# Altium footprint library ALL.PcbLib: 385 footprints (part 6 of 25)
Each footprint in its own frame and in the unit in brackets; x right, y up, seen from the top. Pads: shape width x height; smd on the part's side, far side on the other; paste and mask are expansions set on the pad; w line width, h text height; cw(c..) or ccw(c..) is an arc to the next point about the centre after c.
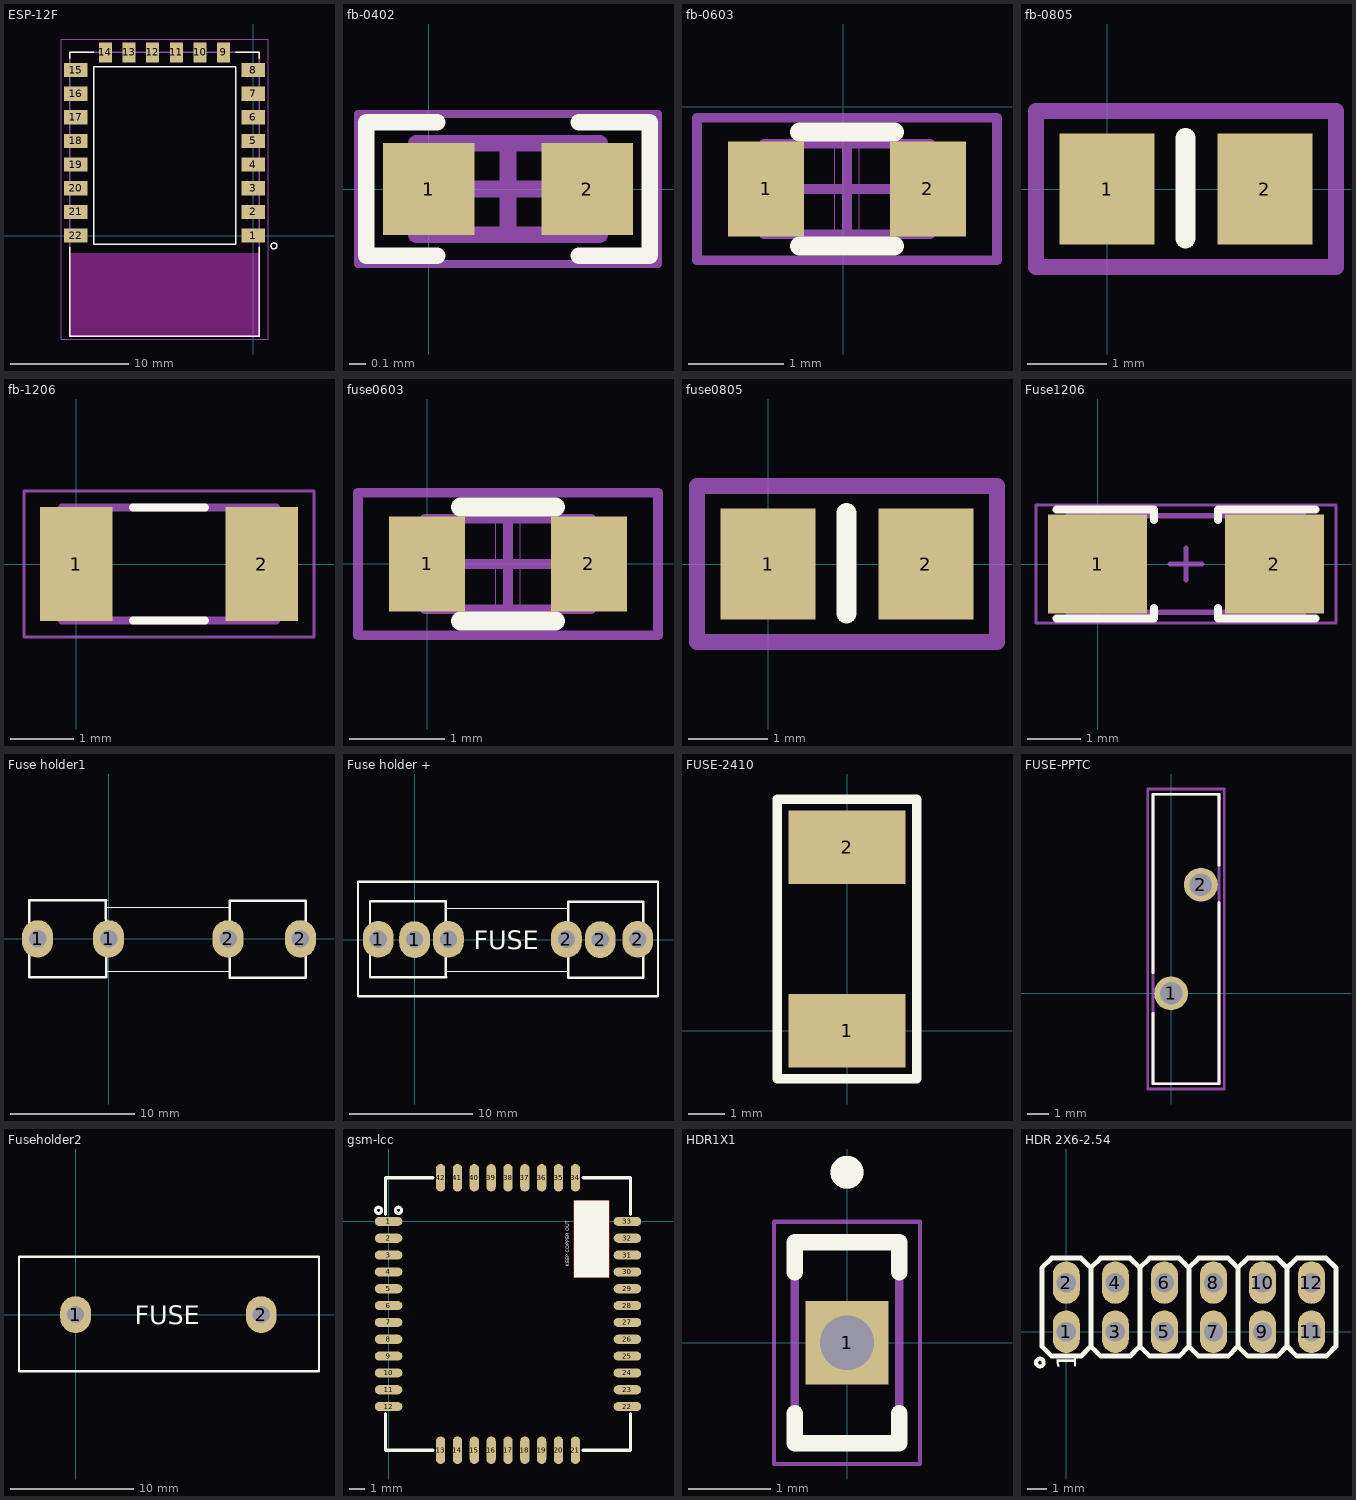
[diagram p5: the footprints below, top view; thin cyan lines are the x and y axes]

## ESP-12F [mm]
pads (22):
  rect 2x1.2 smd: 1(0,0) 2(0,2) 3(0,4) 4(0,6) 5(0,8) 6(0,10) 7(0,12) 8(0,14) 15(-15,14) 16(-15,12) 17(-15,10) 18(-15,8) 19(-15,6) 20(-15,4) 21(-15,2) 22(-15,0)
  rect 1.1x1.7 smd: 9(-2.5,15.5) 10(-4.5,15.5) 11(-6.5,15.5) 12(-8.5,15.5) 13(-10.5,15.5) 14(-12.5,15.5)
Top Overlay:
  circle w0.127: c1.75,-0.875 r0.25
  lines w0.127: -15.5,-1 -15.5,-8.5 0.5,-8.5 0.5,-1 ; -15.5,15 -15.5,15.5 -13.5,15.5 ; -1.5,15.5 0.5,15.5 0.5,15 ; -13.5,-0.74 -13.5,14.26 -1.5,14.26 -1.5,-0.74 -13.5,-0.74
Keep-Out Layer:
  region: -15.5,-1.51 0.509,-1.51 0.509,-8.5 -15.5,-8.5
  region: -15.5,-1.51 0.509,-1.51 0.509,-8.5 -15.5,-8.5
Mechanical 13:
  lines w0.127: -15.5,-8.5 -15.5,15.5 0.5,15.5 0.5,-8.5 -15.5,-8.5
Mechanical 15:
  lines w0.05: -16.25,-8.75 1.25,-8.75 1.25,16.625 -16.25,16.625 -16.25,-8.75
3D body "ESP-12S--3DModel-STEP-56544.STEP": height 3.2, standoff 0, extent -15.627,-8.429 0.373,15.571

## fb-0402 [mm]
pads (2):
  rect 0.55x0.55 smd mask+0.06: 1(0,0) 2(0.95,0)
Top Overlay:
  lines w0.1: 0.05,-0.4 -0.375,-0.4 -0.375,0.4 0.05,0.4 ; 0.9,-0.4 1.325,-0.4 1.325,0.4 0.9,0.4
Mechanical 13:
  lines w0.1: -0.075,-0.275 1.025,-0.275 1.025,0.275 -0.075,0.275 -0.075,-0.275
Mechanical 15:
  lines w0.05: -0.425,-0.45 1.375,-0.45 1.375,0.45 -0.425,0.45 -0.425,-0.45
  lines w0.1: 0.2,0 0.75,0 ; 0.475,-0.275 0.475,0.275
3D body "User Library-FB_1005.STEP": height 0.5, standoff 0, extent -0.025,-0.25 0.975,0.25

## fb-0603 [mm]
pads (2):
  rect 0.8x1 smd: 1(-0.813,-0.864) 2(0.887,-0.864)
Top Overlay:
  lines w0.2: -0.463,-1.464 0.537,-1.464 ; -0.463,-0.264 0.537,-0.264
Mechanical 10:
  lines w0.01: -0.09,-1.372 0.139,-1.372 0.164,-1.397 0.164,-0.356 -0.09,-0.356 -0.09,-1.372
Mechanical 13:
  lines w0.1: -0.838,-1.339 0.912,-1.339 0.912,-0.389 -0.838,-0.389 -0.838,-1.339
Mechanical 15:
  lines w0.1: -0.438,-0.864 0.512,-0.864 ; 0.037,-1.339 0.037,-0.389 ; -1.538,-1.614 1.612,-1.614 1.612,-0.114 -1.538,-0.114 -1.538,-1.614
3D body "User Library-FB_1608-1.STEP": height 0.8, standoff 0, extent -0.763,-1.264 0.837,-0.464

## fb-0805 [mm]
pads (2):
  rect 1.2x1.4 smd: 1(0,0) 2(2,0)
Top Overlay:
  lines w0.254: 0.994,-0.625 0.994,0.645
Mechanical 15:
  lines w0.203: -0.9,-0.991 2.9,-0.991 2.9,0.991 -0.9,0.991 -0.9,-0.991
3D body "User Library-FB_2012.STEP": height 0.85, standoff 0, extent 0.092,-0.6 2.092,0.65

## fb-1206 [mm]
pads (2):
  rect 1.16x1.82 smd: 1(0,0) 2(2.95,0)
Top Overlay:
  lines w0.127: 0.905,-0.9 2.045,-0.9 ; 0.905,0.9 2.045,0.9
Mechanical 13:
  lines w0.127: -0.225,-0.9 -0.225,0.9 3.175,0.9 3.175,-0.9 -0.225,-0.9
Mechanical 15:
  lines w0.05: -0.833,-1.158 -0.833,1.158 3.783,1.158 3.783,-1.158 -0.833,-1.158
3D body "User Library-1206 Ferrite bead.STEP": height 1.65, standoff 0.35, extent -0.127,-0.8 3.073,0.8

## fuse0603 [mm]
pads (2):
  rect 0.8x1 smd: 1(0,0) 2(1.7,0)
Top Overlay:
  lines w0.2: 0.35,-0.6 1.35,-0.6 ; 0.35,0.6 1.35,0.6
Mechanical 10:
  lines w0.01: 0.723,-0.508 0.723,0.508 0.977,0.508 0.977,-0.533 0.952,-0.508 0.723,-0.508
Mechanical 13:
  lines w0.1: -0.025,-0.475 -0.025,0.475 1.725,0.475 1.725,-0.475 -0.025,-0.475
Mechanical 15:
  lines w0.1: 0.375,0 1.325,0 ; 0.85,-0.475 0.85,0.475 ; -0.725,-0.75 -0.725,0.75 2.425,0.75 2.425,-0.75 -0.725,-0.75
3D body "User Library-USF_0603_Surface_Mount_Fuse.STEP": height 0.63, standoff 0, extent 0.165,-0.374 1.765,0.425

## fuse0805 [mm]
pads (2):
  rect 1.2x1.4 smd: 1(0,0) 2(2,0)
Top Overlay:
  lines w0.254: 0.994,-0.625 0.994,0.645
Mechanical 15:
  lines w0.203: -0.9,-0.991 -0.9,0.991 2.9,0.991 2.9,-0.991 -0.9,-0.991
3D body "User Library-fuse0805L050WR.STEP": height 1.24, standoff 0, extent -0.14,-0.749 2.07,0.749

## Fuse1206 [mm]
pads (2):
  rect 1.85x1.85 smd: 1(0,0) 2(3.3,0)
Top Overlay:
  lines w0.15: -0.763,-1.016 1.05,-1.016 1.05,-0.825 ; -0.763,1.016 1.05,1.016 1.05,0.825 ; 2.25,-0.825 2.25,-1.016 4.063,-1.016 ; 2.25,0.825 2.25,1.016 4.063,1.016
Mechanical 13:
  lines w0.1: -0.55,-0.9 3.85,-0.9 3.85,0.9 -0.55,0.9 -0.55,-0.9
Mechanical 15:
  lines w0.05: -1.15,-1.1 4.45,-1.1 4.45,1.1 -1.15,1.1 -1.15,-1.1
  lines w0.1: 1.35,0 1.95,0 ; 1.65,-0.3 1.65,0.3
3D body "User Library-nona SMD075F.STEP": height 0.66, standoff 0.1, extent 0.049,-0.826 3.251,0.826

## Fuse holder1 [mm]
pads (4):
  oval 2.5x3 hole 1.4: 1(-5.7,0) 1(0,0) 2(9.6,0) 2(15.4,0)
Top Overlay:
  lines w0.1: -0.213,2.517 9.745,2.517 ; -0.205,-2.591 9.745,-2.591
  lines w0.2: -0.215,3.115 -0.205,0.005 -0.205,-3.075 ; -0.205,3.105 -6.376,3.105 -6.376,-3.085 -0.175,-3.085 ; 9.725,-3.135 15.849,-3.135 15.849,3.055 9.835,3.055 ; 9.745,-3.145 9.745,3.045
3D body "alsrobot-Fuse.STEP": height 9.89, standoff -3.01, extent -5.837,-3.115 15.441,3.076

## Fuse holder + [mm]
pads (6):
  oval 2.5x3 hole 1.4: 1(-2.946,0.025) 1(0,0) 1(2.754,0.025) 2(12.354,0.025) 2(15.1,0) 2(18.154,0.025)
Top Overlay:
  lines w0.1: 2.541,2.543 12.499,2.543 ; 2.549,-2.565 12.499,-2.565
  lines w0.2: 2.539,3.14 2.549,0.03 2.549,-3.05 ; 2.549,3.13 -3.622,3.13 -3.622,-3.06 2.579,-3.06 ; 12.479,-3.11 18.603,-3.11 18.603,3.08 12.589,3.08 ; 12.499,-3.12 12.499,3.07 ; -4.6,-4.6 19.7,-4.6 19.8,-4.6 19.8,4.7 -4.6,4.7 -4.6,-4.6
  text "FUSE" at 4.8,-0.8 h1.52
3D body "alsrobot-Fuse.STEP": height 9.89, standoff -3.01, extent -3.084,-3.089 18.194,3.101
3D body "fuse holder.stp": height 14, standoff -3, extent -4.6,-4.7 19.8,4.7

## FUSE-2410 [mm]
pads (2):
  rect 3.18x2 smd: 1(0,0) 2(0,5)
Top Overlay:
  lines w0.254: -1.905,-1.31 1.905,-1.31 1.905,6.31 -1.905,6.31 -1.905,-1.31
3D body "User Library-2410 fuse.STEP": height 1.08, standoff -1.08, extent -1.225,-0.474 1.275,5.706

## FUSE-PPTC [mm]
pads (2):
  round 1.59 hole 1.06: 1(0,0) 2(1.4,5.1)
Top Overlay:
  lines w0.127: -0.85,-0.94 -0.85,-4.24 2.25,-4.24 2.25,4.26 ; -0.85,0.96 -0.85,9.34 2.25,9.34 2.25,6.01
Mechanical 13:
  lines w0.127: -0.85,-4.24 2.25,-4.24 2.25,9.34 -0.85,9.34 -0.85,-4.24
Mechanical 15:
  lines w0.127: -1.1,-4.49 2.5,-4.49 2.5,9.59 -1.1,9.59 -1.1,-4.49
3D body "30R250UU--3DModel-STEP-269445.STEP": height 12.16, standoff -13.75, extent -0.697,-3.165 2.351,8.265

## Fuseholder2 [mm]
pads (2):
  oval 2.5x3 hole 1.4: 1(0,0) 2(15.1,0)
Top Overlay:
  lines w0.2: -4.6,-4.6 -4.6,4.7 19.8,4.7 19.8,-4.6 19.7,-4.6 -4.6,-4.6
  text "FUSE" at 4.8,-0.8 h1.52
3D body "fuse holder.stp": height 14, standoff -3, extent -4.6,-4.7 19.8,4.7

## gsm-lcc [mm]
pads (42):
  oval 1.8x0.6 smd: 1(0,0) 2(0,-1.1) 3(0,-2.2) 4(0,-3.3) 5(0,-4.4) 6(0,-5.5) 7(0,-6.6) 8(0,-7.7) 9(0,-8.8) 10(0,-9.9) 11(0,-11) 12(0,-12.1) 22(15.6,-12.1) 23(15.6,-11) 24(15.6,-9.9) 25(15.6,-8.8) 26(15.6,-7.7) 27(15.6,-6.6) 28(15.6,-5.5) 29(15.6,-4.4) 30(15.6,-3.3) 31(15.6,-2.2) 32(15.6,-1.1) 33(15.6,0)
  oval 0.6x1.8 smd: 13(3.4,-14.95) 14(4.5,-14.95) 15(5.6,-14.95) 16(6.7,-14.95) 17(7.8,-14.95) 18(8.9,-14.95) 19(10,-14.95) 20(11.1,-14.95) 21(12.2,-14.95) 34(12.2,2.85) 35(11.1,2.85) 36(10,2.85) 37(8.9,2.85) 38(7.8,2.85) 39(6.7,2.85) 40(5.6,2.85) 41(4.5,2.85) 42(3.4,2.85)
Top Layer:
  pour cut-out: 14.4,1.35 12.1,1.35 12.1,-3.65 14.4,-3.65
Top Overlay:
  circle w0.2: c-0.655,0.724 r0.2
  circle w0.2: c0.645,0.724 r0.2
  rectangle: 12.1,-3.65 14.4,1.35
  lines w0.2: -0.2,-12.55 -0.2,-14.95 2.9,-14.95 ; -0.2,0.45 -0.2,2.85 2.9,2.85 ; 12.7,-14.95 15.8,-14.95 15.8,-12.55 ; 12.7,2.85 15.8,2.85 15.8,0.45
  text "KEEP COPPER OUT" at 11.9,-2.95 h0.4
3D body "SIM800C-1.STEP": height 2.37, standoff 0.03, extent -0.049,-14.862 15.651,2.738

## HDR1X1 [mm]
pads (1):
  rect 1.01x1.01 hole 0.66: 1(0,0)
Top Overlay:
  circle w0.2: c0,2.069 r0.1
  lines w0.2: -0.635,-0.855 -0.635,-1.219 0.635,-1.219 0.635,-0.855 ; -0.635,0.855 -0.635,1.219 0.635,1.219 0.635,0.855
Mechanical 13:
  circle w0.2: c0,2.069 r0.1
  lines w0.1: -0.635,-1.219 0.635,-1.219 0.635,1.219 -0.635,1.219 -0.635,-1.219
Mechanical 15:
  lines w0.05: -0.885,-1.469 -0.885,1.469 0.885,1.469 0.885,-1.469 -0.885,-1.469
3D body "TMS-101-52-S-S.stp": height 7.75, standoff -3.05, extent -0.635,-1.219 0.635,1.219

## HDR 2X6-2.54 [mm]
pads (12):
  oval 1.4x2.2 hole 1: 1(0,0) 2(0,2.54) 3(2.54,0) 4(2.54,2.54) 5(5.08,0) 6(5.08,2.54) 7(7.62,0) 8(7.62,2.54) 9(10.16,0) 10(10.16,2.54) 11(12.7,0) 12(12.7,2.54)
Top Overlay:
  circle w0.2: c-1.37,-1.6 r0.2
  lines w0.254: 1.27,-0.762 1.777,-1.268 3.302,-1.268 3.81,-0.76 3.81,3.304 4.318,3.812 5.841,3.812 6.35,3.302 ; 1.27,3.302 0.761,3.812 -0.762,3.812 -1.27,3.304 -1.27,-0.762 -0.763,-1.268 0.762,-1.268 1.27,-0.76 1.27,3.304 1.778,3.812 3.301,3.812 3.81,3.302 ; 3.81,-0.762 4.317,-1.268 5.842,-1.268 6.35,-0.76 6.35,3.304 6.858,3.812 8.381,3.812 8.89,3.302 ; 6.35,-0.762 6.857,-1.268 8.382,-1.268 8.89,-0.76 8.89,3.304 9.398,3.812 10.921,3.812 11.43,3.302 ; 8.89,-0.762 9.397,-1.268 10.922,-1.268 11.43,-0.76 11.43,3.304 11.938,3.812 13.461,3.812 13.97,3.302 ; 11.43,-0.762 11.937,-1.268 13.462,-1.268 13.97,-0.76 13.97,3.304
  text "1" at 0.508,-1.983 h1
  text "1" at 0.508,-1.983 h1
3D body "PIN.STEP": height 8.43, standoff -2.49, extent 11.43,-1.27 13.97,1.27
3D body "PIN.STEP": height 8.43, standoff -2.49, extent 11.43,1.27 13.97,3.81
3D body "PIN.STEP": height 8.43, standoff -2.49, extent -1.27,1.27 1.27,3.81
3D body "PIN_mid.STEP": height 8.43, standoff -2.49, extent 8.89,-1.27 11.43,1.27
3D body "PIN_mid.STEP": height 8.43, standoff -2.49, extent 6.35,-1.27 8.89,1.27
3D body "PIN_mid.STEP": height 8.43, standoff -2.49, extent 3.81,-1.27 6.35,1.27
3D body "PIN_mid.STEP": height 8.43, standoff -2.49, extent 1.27,-1.27 3.81,1.27
3D body "PIN_mid.STEP": height 8.43, standoff -2.49, extent 1.27,1.27 3.81,3.81
3D body "PIN_mid.STEP": height 8.43, standoff -2.49, extent 8.89,1.27 11.43,3.81
3D body "PIN_mid.STEP": height 8.43, standoff -2.49, extent 6.35,1.27 8.89,3.81
3D body "PIN_mid.STEP": height 8.43, standoff -2.49, extent 3.81,1.27 6.35,3.81
3D body "PIN.STEP": height 8.43, standoff -2.49, extent -1.27,-1.27 1.27,1.27